# Altium footprint library 7-Connectors-13.PcbLib: 44 footprints (part 2 of 5)
Each footprint in its own frame and in the unit in brackets; x right, y up, seen from the top. Pads: shape width x height; smd on the part's side, far side on the other; paste and mask are expansions set on the pad; w line width, h text height; cw(c..) or ccw(c..) is an arc to the next point about the centre after c.
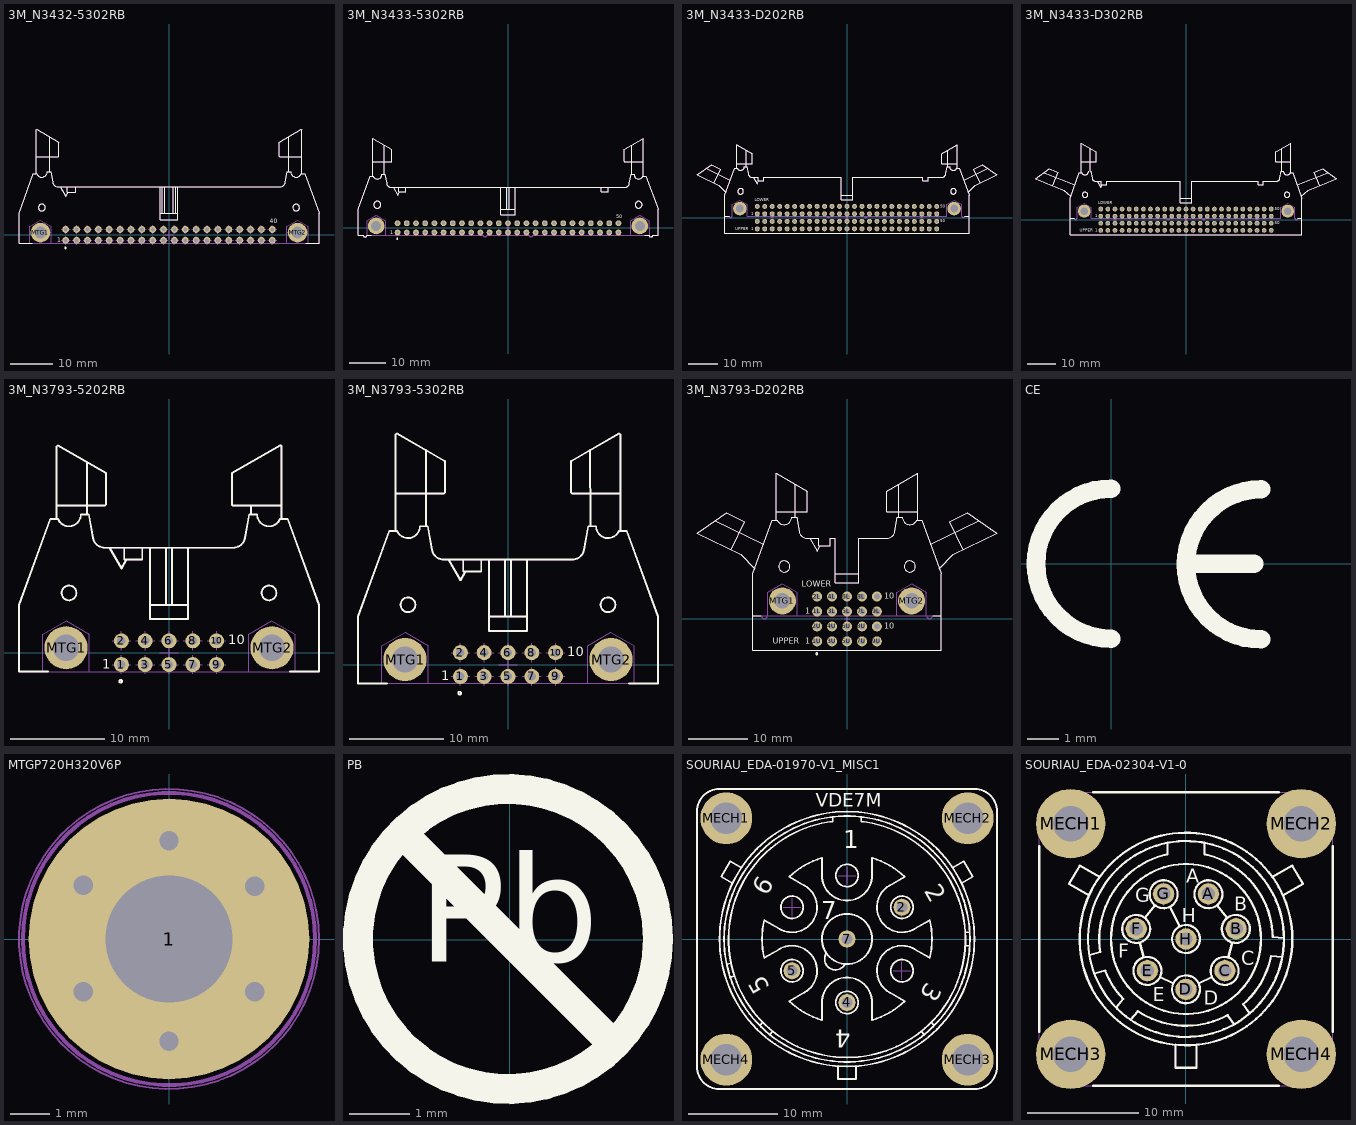
[diagram p1: the footprints below, top view; thin cyan lines are the x and y axes]

## 3M_N3432-5302RB [mm] "3M, 3000 Series, 40 Contacts - Pitch 2.54mm - Right Angle Four-Wall Header (Black) With Long Roll Pin Latch/Ejectors"
height 8.6
pads (42):
  round 1.6 hole 0.9: 1(-24.13,-1.27) 2(-24.13,1.27) 3(-21.59,-1.27) 4(-21.59,1.27) 5(-19.05,-1.27) 6(-19.05,1.27) 7(-16.51,-1.27) 8(-16.51,1.27) 9(-13.97,-1.27) 10(-13.97,1.27) 11(-11.43,-1.27) 12(-11.43,1.27) 13(-8.89,-1.27) 14(-8.89,1.27) 15(-6.35,-1.27) 16(-6.35,1.27) 17(-3.81,-1.27) 18(-3.81,1.27) 19(-1.27,-1.27) 20(-1.27,1.27) 21(1.27,-1.27) 22(1.27,1.27) 23(3.81,-1.27) 24(3.81,1.27) 25(6.35,-1.27) 26(6.35,1.27) 27(8.89,-1.27) 28(8.89,1.27) 29(11.43,-1.27) 30(11.43,1.27) 31(13.97,-1.27) 32(13.97,1.27) 33(16.51,-1.27) 34(16.51,1.27) 35(19.05,-1.27) 36(19.05,1.27) 37(21.59,-1.27) 38(21.59,1.27) 39(24.13,-1.27) 40(24.13,1.27)
  round 4.6 hole 2.8: MTG1(-30.036,0.533) MTG2(30.042,0.533)
Top Overlay:
  circle w0.2: c-29.718,6.375 r0.787
  circle w0.2: c29.718,6.375 r0.787
  circle w0.2: c-24.203,-3.048 r0.15
  lines w0.2: -31.94,-2.007 -35.052,-2.007 -35.052,5.105 -31.724,14.249 -30.882,14.249 ccw(c-29.718,14.757) -28.448,14.757 -27.606,14.757 -27.164,12.251 ccw(c-25.913,12.471) -25.913,11.201 25.913,11.201 ccw(c25.913,12.471) 27.164,12.251 27.606,14.757 28.448,14.757 ccw(c29.718,14.757) 30.882,14.249 31.724,14.249 35.052,5.105 35.052,-2.007 31.94,-2.007 ; -31.039,14.249 -31.039,24.561 -30.886,24.649 -25.781,21.702 -25.781,18.336 -25.883,18.235 -31.039,18.235 ; -27.813,14.757 -27.813,22.875 ; -25.394,11.201 -24.124,9.002 -23.587,9.931 ; -23.819,11.201 -23.819,9.931 -21.901,9.931 -21.908,11.201 ; -2.032,5.105 2.032,5.105 ; -2.032,11.201 -2.032,3.581 2.032,3.581 2.032,11.201 ; -1.581,5.105 -1.581,11.201 ; -0.946,5.105 -0.946,11.201 ; 0.959,5.105 0.959,11.201 ; 1.594,5.105 1.594,11.201 ; 27.837,14.757 27.837,22.875 ; 31.039,14.249 31.039,24.561 30.886,24.649 25.781,21.702 25.781,18.336 25.883,18.235 31.039,18.235
  text "40" at 23.495,2.667 h1.02
  text "1" at -26.162,-1.7 h1.02
Mechanical 8:
  drawing of 172 lines, arcs and shapes, not listed
Mechanical 14:
  circle w0.1: c-30.036,0.533 r1.27
  circle w0.1: c-29.718,6.375 r0.787
  circle w0.1: c30.036,0.533 r1.27
  circle w0.1: c29.718,6.375 r0.787
  lines w0.1: -32.537,-2.007 -32.537,1.978 -30.036,3.422 -27.534,1.978 -27.534,-2.007 ; -31.039,14.249 -31.039,24.561 -30.886,24.649 -25.781,21.702 -25.781,18.336 -25.883,18.235 -31.039,18.235 ; -27.813,14.757 -27.813,22.875 ; -25.394,11.201 -24.124,9.002 -23.587,9.931 ; -23.819,11.201 -23.819,9.931 -21.901,9.931 -21.908,11.201 ; -2.032,5.105 2.032,5.105 ; -2.032,11.201 -2.032,3.581 2.032,3.581 2.032,11.201 ; -1.581,5.105 -1.581,11.201 ; -0.946,5.105 -0.946,11.201 ; 0.959,5.105 0.959,11.201 ; 1.594,5.105 1.594,11.201 ; 27.534,-2.007 27.534,1.978 30.036,3.422 32.537,1.978 32.537,-2.007 ; 27.837,14.757 27.837,22.875 ; 31.039,14.249 31.039,24.561 30.886,24.649 25.781,21.702 25.781,18.336 25.883,18.235 31.039,18.235 ; -35.052,-2.007 -35.052,5.105 -31.724,14.249 -30.882,14.249 ccw(c-29.718,14.757) -28.448,14.757 -27.606,14.757 -27.164,12.251 ccw(c-25.913,12.471) -25.913,11.201 25.913,11.201 ccw(c25.913,12.471) 27.164,12.251 27.606,14.757 28.448,14.757 ccw(c29.718,14.757) 30.882,14.249 31.724,14.249 35.052,5.105 35.052,-2.007 -35.052,-2.007
  text "40" at 23.495,2.667 h1.02
  text "1" at -26.162,-1.7 h1.02
3D body "3M_N3432-5302RB.stp": height 8.64, standoff -3.94, extent -35.052,-2.532 35.052,24.645

## 3M_N3433-5302RB [mm] "3M, 3000 Series, 50 Contacts - Pitch 2.54mm - Right Angle Four-Wall Header (Black) With Long Roll Pin Latch/Ejectors"
height 8.6
pads (52):
  round 1.6 hole 0.9: 1(-30.48,-1.27) 2(-30.48,1.27) 3(-27.94,-1.27) 4(-27.94,1.27) 5(-25.4,-1.27) 6(-25.4,1.27) 7(-22.86,-1.27) 8(-22.86,1.27) 9(-20.32,-1.27) 10(-20.32,1.27) 11(-17.78,-1.27) 12(-17.78,1.27) 13(-15.24,-1.27) 14(-15.24,1.27) 15(-12.7,-1.27) 16(-12.7,1.27) 17(-10.16,-1.27) 18(-10.16,1.27) 19(-7.62,-1.27) 20(-7.62,1.27) 21(-5.08,-1.27) 22(-5.08,1.27) 23(-2.54,-1.27) 24(-2.54,1.27) 25(0,-1.27) 26(0,1.27) 27(2.54,-1.27) 28(2.54,1.27) 29(5.08,-1.27) 30(5.08,1.27) 31(7.62,-1.27) 32(7.62,1.27) 33(10.16,-1.27) 34(10.16,1.27) 35(12.7,-1.27) 36(12.7,1.27) 37(15.24,-1.27) 38(15.24,1.27) 39(17.78,-1.27) 40(17.78,1.27) 41(20.32,-1.27) 42(20.32,1.27) 43(22.86,-1.27) 44(22.86,1.27) 45(25.4,-1.27) 46(25.4,1.27) 47(27.94,-1.27) 48(27.94,1.27) 49(30.48,-1.27) 50(30.48,1.27)
  round 4.6 hole 2.8: MTG1(-36.386,0.533) MTG2(36.386,0.533)
Top Overlay:
  circle w0.2: c36.068,6.375 r0.953
  circle w0.2: c-36.068,6.375 r0.953
  circle w0.2: c-30.553,-3.048 r0.15
  lines w0.2: -37.785,-2.007 -38.91,-2.007 cw(c-39.422,-2.007) -39.934,-2.007 -41.402,-2.007 -41.402,5.105 -38.074,14.249 -37.232,14.249 ccw(c-36.068,14.757) -34.798,14.757 -33.956,14.757 -33.514,12.251 ccw(c-32.263,12.471) -32.263,11.201 32.263,11.201 ccw(c32.263,12.471) 33.514,12.251 33.956,14.757 34.798,14.757 ccw(c36.068,14.757) 37.232,14.249 38.074,14.249 41.402,5.105 41.402,-2.007 39.954,-2.007 cw(c39.445,-2.007) 38.936,-2.007 37.785,-2.007 ; -37.389,14.249 -37.389,24.561 cw(c-37.287,24.561) -37.236,24.649 -32.131,21.702 -32.131,18.336 cw(c-32.233,18.336) -32.233,18.235 -37.389,18.235 ; -34.163,14.757 -34.163,22.875 ; -30.169,11.201 -30.169,9.931 -29.861,9.931 ; -28.251,11.201 -28.251,9.931 -29.861,9.931 ; -2.019,5.105 2.032,5.105 ; -2.019,11.201 -2.019,3.581 2.032,3.581 2.032,11.201 ; -0.318,5.105 -0.318,11.201 0.318,11.201 0.318,5.105 ; 25.718,11.201 25.711,9.931 27.623,9.931 27.629,11.201 -31.667,11.201 -30.397,9.002 -29.861,9.931 ; 34.163,14.757 34.163,22.875 ; 37.389,14.249 37.389,24.561 ccw(c37.287,24.561) 37.236,24.649 32.131,21.702 32.131,18.336 ccw(c32.233,18.336) 32.233,18.235 37.389,18.235
  text "50" at 29.845,2.667 h1.02
  text "1" at -32.512,-1.7 h1.02
Mechanical 8:
  drawing of 212 lines, arcs and shapes, not listed
Mechanical 14:
  circle w0.1: c36.068,6.375 r0.953
  circle w0.1: c-36.068,6.375 r0.953
  lines w0.1: -38.887,-2.007 -38.887,1.978 -36.386,3.422 -33.884,1.978 -33.846,-2.006 ; -37.389,14.249 -37.389,24.561 cw(c-37.287,24.561) -37.236,24.649 -32.131,21.702 -32.131,18.336 cw(c-32.233,18.336) -32.233,18.235 -37.389,18.235 ; -34.163,14.757 -34.163,22.875 ; -30.169,11.201 -30.169,9.931 -29.861,9.931 ; -28.251,11.201 -28.251,9.931 -29.861,9.931 ; -2.019,5.105 2.032,5.105 ; -2.019,11.201 -2.019,3.581 2.032,3.581 2.032,11.201 ; -0.318,5.105 -0.318,11.201 0.318,11.201 0.318,5.105 ; 25.718,11.201 25.711,9.931 27.623,9.931 27.629,11.201 -31.667,11.201 -30.397,9.002 -29.861,9.931 ; 33.884,-2.007 33.884,1.978 36.386,3.422 38.887,1.978 38.926,-2.006 ; 34.163,14.757 34.163,22.875 ; 37.389,14.249 37.389,24.561 ccw(c37.287,24.561) 37.236,24.649 32.131,21.702 32.131,18.336 ccw(c32.233,18.336) 32.233,18.235 37.389,18.235 ; -41.402,-2.007 -39.934,-2.007 ccw(c-39.422,-2.007) -38.91,-2.007 -6.858,-2.007 ccw(c-6.35,-2.007) -5.842,-2.007 5.842,-2.007 ccw(c6.35,-2.007) 6.858,-2.007 38.936,-2.007 ccw(c39.445,-2.007) 39.954,-2.007 41.402,-2.007 41.402,5.105 38.074,14.249 37.232,14.249 cw(c36.068,14.757) 34.798,14.757 33.956,14.757 33.514,12.251 cw(c32.263,12.471) 32.263,11.201 -32.263,11.201 cw(c-32.263,12.471) -33.514,12.251 -33.956,14.757 -34.798,14.757 cw(c-36.068,14.757) -37.232,14.249 -38.074,14.249 -41.402,5.105 -41.402,-2.007
  text "50" at 29.845,2.667 h1.02
  text "1" at -32.512,-1.7 h1.02
3D body "3M_N3433-5302RB.stp": height 8.64, standoff -3.94, extent -41.402,-2.514 41.402,24.663

## 3M_N3433-D202RB [mm] "3M, 3000 Series, 2x50 Contacts - Pitch 2.54mm - Right Angle Four-Wall Condo Header (Black) With Short Roll Pin Latch/Ejectors"
height 15.5
pads (102):
  round 1.7 hole 1: 1L(-30.48,1.27) 1U(-30.48,-3.81) 2L(-30.48,3.81) 2U(-30.48,-1.27) 3L(-27.94,1.27) 3U(-27.94,-3.81) 4L(-27.94,3.81) 4U(-27.94,-1.27) 5L(-25.4,1.27) 5U(-25.4,-3.81) 6L(-25.4,3.81) 6U(-25.4,-1.27) 7L(-22.86,1.27) 7U(-22.86,-3.81) 8L(-22.86,3.81) 8U(-22.86,-1.27) 9L(-20.32,1.27) 9U(-20.32,-3.81) 10L(-20.32,3.81) 10U(-20.32,-1.27) 11L(-17.78,1.27) 11U(-17.78,-3.81) 12L(-17.78,3.81) 12U(-17.78,-1.27) 13L(-15.24,1.27) 13U(-15.24,-3.81) 14L(-15.24,3.81) 14U(-15.24,-1.27) 15L(-12.7,1.27) 15U(-12.7,-3.81) 16L(-12.7,3.81) 16U(-12.7,-1.27) 17L(-10.16,1.27) 17U(-10.16,-3.81) 18L(-10.16,3.81) 18U(-10.16,-1.27) 19L(-7.62,1.27) 19U(-7.62,-3.81) 20L(-7.62,3.81) 20U(-7.62,-1.27) 21L(-5.08,1.27) 21U(-5.08,-3.81) 22L(-5.08,3.81) 22U(-5.08,-1.27) 23L(-2.54,1.27) 23U(-2.54,-3.81) 24L(-2.54,3.81) 24U(-2.54,-1.27) 25L(0,1.27) 25U(0,-3.81) 26L(0,3.81) 26U(0,-1.27) 27L(2.54,1.27) 27U(2.54,-3.81) 28L(2.54,3.81) 28U(2.54,-1.27) 29L(5.08,1.27) 29U(5.08,-3.81) 30L(5.08,3.81) 30U(5.08,-1.27) 31L(7.62,1.27) 31U(7.62,-3.81) 32L(7.62,3.81) 32U(7.62,-1.27) 33L(10.16,1.27) 33U(10.16,-3.81) 34L(10.16,3.81) 34U(10.16,-1.27) 35L(12.7,1.27) 35U(12.7,-3.81) 36L(12.7,3.81) 36U(12.7,-1.27) 37L(15.24,1.27) 37U(15.24,-3.81) 38L(15.24,3.81) 38U(15.24,-1.27) 39L(17.78,1.27) 39U(17.78,-3.81) 40L(17.78,3.81) 40U(17.78,-1.27) 41L(20.32,1.27) 41U(20.32,-3.81) 42L(20.32,3.81) 42U(20.32,-1.27) 43L(22.86,1.27) 43U(22.86,-3.81) 44L(22.86,3.81) 44U(22.86,-1.27) 45L(25.4,1.27) 45U(25.4,-3.81) 46L(25.4,3.81) 46U(25.4,-1.27) 47L(27.94,1.27) 47U(27.94,-3.81) 48L(27.94,3.81) 48U(27.94,-1.27) 49L(30.48,1.27) 49U(30.48,-3.81) 50L(30.48,3.81) 50U(30.48,-1.27)
  round 4.6 hole 2.6: MTG1(-36.385,3.07) MTG2(36.385,3.07)
Top Overlay:
  circle w0.2: c-36.116,8.915 r0.953
  circle w0.2: c-36.116,8.915 r0.953
  circle w0.2: c36.116,8.915 r0.953
  circle w0.2: c36.116,8.915 r0.953
  circle w0.2: c-36.116,8.915 r0.953
  lines w0.2: -47.871,16.687 -39.607,12.71 ; -45.088,11.768 -42.808,16.505 -45.932,18.009 -50.948,14.588 -43.517,11.011 -41.119,8.554 ; -41.45,0.533 -39.99,0.533 ; -37.437,16.789 -37.437,24.74 -32.179,21.704 -32.179,18.237 -37.437,18.237 ; -34.211,17.297 -34.211,22.877 ; -31.766,13.741 -30.496,11.542 -29.96,12.471 ; -2.032,7.645 2.032,7.645 ; 34.211,17.297 34.211,22.877 ; 37.437,16.789 37.437,24.74 32.179,21.704 32.179,18.237 37.437,18.237 ; 39.607,12.71 47.871,16.687 ; 39.99,0.533 41.45,0.533 ; 41.119,8.554 43.517,11.011 50.948,14.588 45.932,18.009 42.808,16.505 45.088,11.768 ; -41.45,-5.309 41.45,-5.309 41.45,7.645 38.122,16.789 37.28,16.789 cw(c36.116,17.297) 34.846,17.297 34.004,17.297 33.574,14.859 cw(c32.277,15.053) 32.242,13.741 27.677,13.741 27.677,12.471 25.759,12.471 25.759,13.741 2.032,13.741 2.032,6.121 -2.032,6.121 -2.032,13.741 -28.299,13.741 -28.299,12.471 -30.217,12.471 -30.217,13.741 -32.242,13.741 cw(c-32.277,15.053) -33.574,14.859 -34.004,17.297 -34.846,17.297 cw(c-36.116,17.297) -37.28,16.789 -38.122,16.789 -41.45,7.645 -41.45,-5.309
  text "1" at -32.512,0.84 h1.02
  text "LOWER" at -31.365,5.475 h1
  text "UPPER" at -37.99,-4.25 h1
  text "1" at -32.512,-4.24 h1.02
  text "50" at 31.74,3.429 h1.02
  text "50" at 31.74,-1.651 h1.02
Mechanical 8:
  drawing of 410 lines, arcs and shapes, not listed
Mechanical 14:
  circle w0.1: c36.116,8.915 r0.953
  circle w0.1: c-36.116,8.915 r0.953
  circle w0.1: c36.385,3.07 r1.27
  circle w0.1: c-36.385,3.07 r1.27
  lines w0.1: -47.871,16.687 -39.607,12.71 ; -45.088,11.768 -42.808,16.505 -45.932,18.009 -50.948,14.588 -43.517,11.011 -41.119,8.554 ; -41.45,0.533 -39.99,0.533 ccw(c-39.482,0.533) -38.974,0.533 -38.935,0.533 -38.935,4.518 -36.434,5.962 -33.932,4.518 -33.932,0.533 33.932,0.533 33.932,4.518 36.434,5.962 38.935,4.518 38.935,0.533 38.974,0.533 ccw(c39.482,0.533) 39.99,0.533 41.45,0.533 ; -37.437,16.789 -37.437,24.74 -32.179,21.704 -32.179,18.237 -37.437,18.237 ; -34.211,17.297 -34.211,22.877 ; -31.766,13.741 -30.496,11.542 -29.96,12.471 ; -25.908,0.533 ccw(c-25.4,0.533) -24.892,0.533 ; -6.858,0.533 ccw(c-6.35,0.533) -5.842,0.533 ; -2.032,7.645 2.032,7.645 ; 5.842,0.533 ccw(c6.35,0.533) 6.858,0.533 ; 24.892,0.533 ccw(c25.4,0.533) 25.908,0.533 ; 34.211,17.297 34.211,22.877 ; 37.437,16.789 37.437,24.74 32.179,21.704 32.179,18.237 37.437,18.237 ; 39.607,12.71 47.871,16.687 ; 41.119,8.554 43.517,11.011 50.948,14.588 45.932,18.009 42.808,16.505 45.088,11.768 ; -41.45,-5.309 41.45,-5.309 41.45,7.645 38.122,16.789 37.28,16.789 cw(c36.116,17.297) 34.846,17.297 34.004,17.297 33.574,14.859 cw(c32.277,15.053) 32.242,13.741 27.677,13.741 27.677,12.471 25.759,12.471 25.759,13.741 2.032,13.741 2.032,6.121 -2.032,6.121 -2.032,13.741 -28.299,13.741 -28.299,12.471 -30.217,12.471 -30.217,13.741 -32.242,13.741 cw(c-32.277,15.053) -33.574,14.859 -34.004,17.297 -34.846,17.297 cw(c-36.116,17.297) -37.28,16.789 -38.122,16.789 -41.45,7.645 -41.45,-5.309
  text "1" at -32.512,0.84 h1.02
  text "LOWER" at -31.365,5.475 h1
  text "UPPER" at -37.99,-4.25 h1
  text "1" at -32.512,-4.24 h1.02
  text "1" at -32.512,-4.24 h1.02
  text "50" at 31.74,-1.651 h1.02
  text "50" at 31.74,3.429 h1.02
3D body "3M_N3433-D202RB.stp": height 15.49, standoff -3.81, extent -50.846,-5.309 50.846,18.009

## 3M_N3433-D302RB [mm] "3M, 3000 Series, 2x50 Contacts - Pitch 2.54mm - Right Angle Four-Wall Condo Header (Black) With Long Roll Pin Latch/Ejectors"
height 15.5
pads (102):
  round 1.7 hole 1: 1L(-30.48,1.27) 1U(-30.48,-3.81) 2L(-30.48,3.81) 2U(-30.48,-1.27) 3L(-27.94,1.27) 3U(-27.94,-3.81) 4L(-27.94,3.81) 4U(-27.94,-1.27) 5L(-25.4,1.27) 5U(-25.4,-3.81) 6L(-25.4,3.81) 6U(-25.4,-1.27) 7L(-22.86,1.27) 7U(-22.86,-3.81) 8L(-22.86,3.81) 8U(-22.86,-1.27) 9L(-20.32,1.27) 9U(-20.32,-3.81) 10L(-20.32,3.81) 10U(-20.32,-1.27) 11L(-17.78,1.27) 11U(-17.78,-3.81) 12L(-17.78,3.81) 12U(-17.78,-1.27) 13L(-15.24,1.27) 13U(-15.24,-3.81) 14L(-15.24,3.81) 14U(-15.24,-1.27) 15L(-12.7,1.27) 15U(-12.7,-3.81) 16L(-12.7,3.81) 16U(-12.7,-1.27) 17L(-10.16,1.27) 17U(-10.16,-3.81) 18L(-10.16,3.81) 18U(-10.16,-1.27) 19L(-7.62,1.27) 19U(-7.62,-3.81) 20L(-7.62,3.81) 20U(-7.62,-1.27) 21L(-5.08,1.27) 21U(-5.08,-3.81) 22L(-5.08,3.81) 22U(-5.08,-1.27) 23L(-2.54,1.27) 23U(-2.54,-3.81) 24L(-2.54,3.81) 24U(-2.54,-1.27) 25L(0,1.27) 25U(0,-3.81) 26L(0,3.81) 26U(0,-1.27) 27L(2.54,1.27) 27U(2.54,-3.81) 28L(2.54,3.81) 28U(2.54,-1.27) 29L(5.08,1.27) 29U(5.08,-3.81) 30L(5.08,3.81) 30U(5.08,-1.27) 31L(7.62,1.27) 31U(7.62,-3.81) 32L(7.62,3.81) 32U(7.62,-1.27) 33L(10.16,1.27) 33U(10.16,-3.81) 34L(10.16,3.81) 34U(10.16,-1.27) 35L(12.7,1.27) 35U(12.7,-3.81) 36L(12.7,3.81) 36U(12.7,-1.27) 37L(15.24,1.27) 37U(15.24,-3.81) 38L(15.24,3.81) 38U(15.24,-1.27) 39L(17.78,1.27) 39U(17.78,-3.81) 40L(17.78,3.81) 40U(17.78,-1.27) 41L(20.32,1.27) 41U(20.32,-3.81) 42L(20.32,3.81) 42U(20.32,-1.27) 43L(22.86,1.27) 43U(22.86,-3.81) 44L(22.86,3.81) 44U(22.86,-1.27) 45L(25.4,1.27) 45U(25.4,-3.81) 46L(25.4,3.81) 46U(25.4,-1.27) 47L(27.94,1.27) 47U(27.94,-3.81) 48L(27.94,3.81) 48U(27.94,-1.27) 49L(30.48,1.27) 49U(30.48,-3.81) 50L(30.48,3.81) 50U(30.48,-1.27)
  round 4.6 hole 2.6: MTG1(-36.385,3.07) MTG2(36.385,3.07)
Top Overlay:
  circle w0.2: c-36.116,8.915 r0.953
  circle w0.2: c-36.116,8.915 r0.953
  circle w0.2: c36.116,8.915 r0.953
  circle w0.2: c36.116,8.915 r0.953
  circle w0.2: c-36.116,8.915 r0.953
  lines w0.2: -50.7,16.862 -39.711,12.422 ; -47.607,12.133 -45.637,17.008 -48.851,18.307 -53.636,14.569 -43.637,10.529 -41.199,8.334 ; -41.45,0.533 -39.99,0.533 ; -37.437,20.775 -32.179,20.775 -32.179,24.241 -37.437,27.277 -37.437,16.789 -37.437,24.739 ; -34.846,17.297 cw(c-36.116,17.297) -37.28,16.789 -38.122,16.789 -41.45,7.645 -41.45,-5.309 41.45,-5.309 41.45,7.645 38.122,16.789 37.28,16.789 cw(c36.116,17.297) 34.846,17.297 34.004,17.297 33.574,14.859 cw(c32.277,15.053) 32.242,13.741 27.677,13.741 27.677,12.471 25.759,12.471 25.759,13.741 2.032,13.741 2.032,6.121 -2.032,6.121 -2.032,13.741 -28.299,13.741 -28.299,12.471 -30.217,12.471 -30.217,13.741 -32.242,13.741 cw(c-32.277,15.053) -33.574,14.859 -34.004,17.297 ; -34.211,17.297 -34.211,25.415 ; -31.766,13.741 -30.496,11.542 -29.96,12.471 ; -2.032,7.645 2.032,7.645 ; 34.211,17.297 34.211,25.415 ; 37.437,16.789 37.437,27.277 32.179,24.241 32.179,20.775 37.437,20.775 ; 39.711,12.422 50.7,16.862 ; 39.989,0.533 41.45,0.533 ; 41.199,8.334 43.637,10.529 53.635,14.569 48.851,18.307 45.637,17.008 47.606,12.133
  text "50" at 31.74,3.429 h1.02
  text "50" at 31.74,-1.651 h1.02
  text "1" at -32.512,0.84 h1.02
  text "LOWER" at -31.365,5.475 h1
  text "UPPER" at -37.99,-4.25 h1
  text "1" at -32.512,-4.24 h1.02
Mechanical 8:
  drawing of 820 lines, arcs and shapes, not listed
Mechanical 14:
  circle w0.1: c36.116,8.915 r0.953
  circle w0.1: c-36.116,8.915 r0.953
  circle w0.1: c36.385,3.07 r1.27
  circle w0.1: c-36.385,3.07 r1.27
  lines w0.1: -50.7,16.862 -39.711,12.422 ; -47.607,12.133 -45.637,17.008 -48.851,18.307 -53.636,14.569 -43.637,10.529 -41.199,8.334 ; -41.45,0.533 -39.99,0.533 ccw(c-39.482,0.533) -38.974,0.533 -38.936,0.533 -38.936,4.518 -36.434,5.962 -33.932,4.518 -33.932,0.533 33.931,0.533 33.931,4.518 36.433,5.962 38.935,4.518 38.935,0.533 38.973,0.533 ccw(c39.481,0.533) 39.989,0.533 41.45,0.533 ; -37.437,20.775 -32.179,20.775 -32.179,24.241 -37.437,27.277 -37.437,16.789 -37.437,24.739 ; -34.846,17.297 cw(c-36.116,17.297) -37.28,16.789 -38.122,16.789 -41.45,7.645 -41.45,-5.309 41.45,-5.309 41.45,7.645 38.122,16.789 37.28,16.789 cw(c36.116,17.297) 34.846,17.297 34.004,17.297 33.574,14.859 cw(c32.277,15.053) 32.242,13.741 27.677,13.741 27.677,12.471 25.759,12.471 25.759,13.741 2.032,13.741 2.032,6.121 -2.032,6.121 -2.032,13.741 -28.299,13.741 -28.299,12.471 -30.217,12.471 -30.217,13.741 -32.242,13.741 cw(c-32.277,15.053) -33.574,14.859 -34.004,17.297 ; -34.211,17.297 -34.211,25.415 ; -31.766,13.741 -30.496,11.542 -29.96,12.471 ; -25.908,0.533 ccw(c-25.4,0.533) -24.892,0.533 ; -6.858,0.533 ccw(c-6.35,0.533) -5.842,0.533 ; -2.032,7.645 2.032,7.645 ; 5.842,0.533 ccw(c6.35,0.533) 6.858,0.533 ; 24.892,0.533 ccw(c25.4,0.533) 25.908,0.533 ; 34.211,17.297 34.211,25.415 ; 37.437,16.789 37.437,27.277 32.179,24.241 32.179,20.775 37.437,20.775 ; 39.711,12.422 50.7,16.862 ; 41.199,8.334 43.637,10.529 53.635,14.569 48.851,18.307 45.637,17.008 47.606,12.133
  text "50" at 31.74,-1.651 h1.02
  text "50" at 31.74,3.429 h1.02
  text "1" at -32.512,0.84 h1.02
  text "LOWER" at -31.365,5.475 h1
  text "UPPER" at -37.99,-4.25 h1
  text "1" at -32.512,-4.24 h1.02
  text "1" at -32.512,-4.24 h1.02
3D body "3M_N3433-D302RB.stp": height 15.49, standoff -3.81, extent -53.535,-5.309 53.535,18.307

## 3M_N3793-5202RB [mm] "3M, 3000 Series, 10 Contacts - Pitch 2.54mm - Right Angle Four-Wall Header (Black) With Short Roll Pin Latch/Ejectors"
height 8.6
pads (12):
  round 1.6 hole 0.9: 1(-5.08,-1.27) 2(-5.08,1.27) 3(-2.54,-1.27) 4(-2.54,1.27) 5(0,-1.27) 6(0,1.27) 7(2.54,-1.27) 8(2.54,1.27) 9(5.08,-1.27) 10(5.08,1.27)
  round 4.6 hole 2.8: MTG1(-10.986,0.533) MTG2(10.992,0.533)
Top Overlay:
  circle w0.2: c-10.668,6.375 r0.787
  circle w0.2: c10.668,6.375 r0.787
  circle w0.2: c-5.153,-3.048 r0.15
  lines w0.2: -12.89,-2.007 -16.002,-2.007 -16.002,5.105 -12.674,14.249 -11.832,14.249 ccw(c-10.668,14.757) -9.398,14.757 -8.556,14.757 -8.114,12.251 ccw(c-6.863,12.471) -6.863,11.201 6.863,11.201 ccw(c6.863,12.471) 8.114,12.251 8.556,14.757 9.398,14.757 ccw(c10.668,14.757) 11.832,14.249 12.674,14.249 16.002,5.105 16.002,-2.007 12.89,-2.007 ; -11.989,14.249 -11.989,22.024 -11.836,22.112 -6.731,19.164 -6.731,15.799 -6.833,15.697 -11.989,15.697 ; -8.763,14.757 -8.763,20.337 ; -6.344,11.201 -5.074,9.002 -4.537,9.931 ; -4.769,11.201 -4.769,9.931 -2.851,9.931 -2.858,11.201 ; -2.032,5.105 2.032,5.105 ; -2.032,11.201 -2.032,3.581 2.032,3.581 2.032,11.201 ; -0.318,5.105 -0.318,11.201 ; 0.318,5.105 0.318,11.201 ; 8.763,14.757 8.763,15.697 ; 11.989,14.249 11.989,22.024 ccw(c11.887,22.024) 11.836,22.112 6.731,19.164 6.731,15.799 ccw(c6.833,15.799) 6.833,15.697 11.989,15.697
  text "1" at -7.112,-1.7 h1.02
  text "10" at 6.34,0.889 h1.02
Mechanical 8:
  lines w0.1: -11.986,0.533 -10.986,0.533 ; -10.986,-0.467 -10.986,0.533 ; -10.986,1.533 -10.986,0.533 ; -9.986,0.533 -10.986,0.533 ; -6.08,-1.27 -5.08,-1.27 ; -6.08,1.27 -5.08,1.27 ; -5.08,-2.27 -5.08,-1.27 ; -5.08,-0.27 -5.08,-1.27 ; -5.08,0.27 -5.08,1.27 ; -5.08,2.27 -5.08,1.27 ; -4.08,-1.27 -5.08,-1.27 ; -4.08,1.27 -5.08,1.27 ; -3.54,-1.27 -2.54,-1.27 ; -3.54,1.27 -2.54,1.27 ; -2.54,-2.27 -2.54,-1.27 ; -2.54,-0.27 -2.54,-1.27 ; -2.54,0.27 -2.54,1.27 ; -2.54,2.27 -2.54,1.27 ; -1.54,-1.27 -2.54,-1.27 ; -1.54,1.27 -2.54,1.27 ; -1,-1.27 0,-1.27 ; -1,0 0,0 ; -1,1.27 0,1.27 ; 0,-2.27 0,-1.27 ; 0,-1 0,0 ; 0,-0.27 0,-1.27 ; 0,0.27 0,1.27 ; 0,1 0,0 ; 0,2.27 0,1.27 ; 1,-1.27 0,-1.27 ; 1,0 0,0 ; 1,1.27 0,1.27 ; 1.54,-1.27 2.54,-1.27 ; 1.54,1.27 2.54,1.27 ; 2.54,-2.27 2.54,-1.27 ; 2.54,-0.27 2.54,-1.27 ; 2.54,0.27 2.54,1.27 ; 2.54,2.27 2.54,1.27 ; 3.54,-1.27 2.54,-1.27 ; 3.54,1.27 2.54,1.27 ; 4.08,-1.27 5.08,-1.27 ; 4.08,1.27 5.08,1.27 ; 5.08,-2.27 5.08,-1.27 ; 5.08,-0.27 5.08,-1.27 ; 5.08,0.27 5.08,1.27 ; 5.08,2.27 5.08,1.27 ; 6.08,-1.27 5.08,-1.27 ; 6.08,1.27 5.08,1.27 ; 9.992,0.533 10.992,0.533 ; 10.992,-0.467 10.992,0.533 ; 10.992,1.533 10.992,0.533 ; 11.992,0.533 10.992,0.533